# Altium footprint library PcbLibUltimate (1).pcblib: 202 footprints (part 6 of 13)
Each footprint in its own frame and in the unit in brackets; x right, y up, seen from the top. Pads: shape width x height; smd on the part's side, far side on the other; paste and mask are expansions set on the pad; w line width, h text height; cw(c..) or ccw(c..) is an arc to the next point about the centre after c.
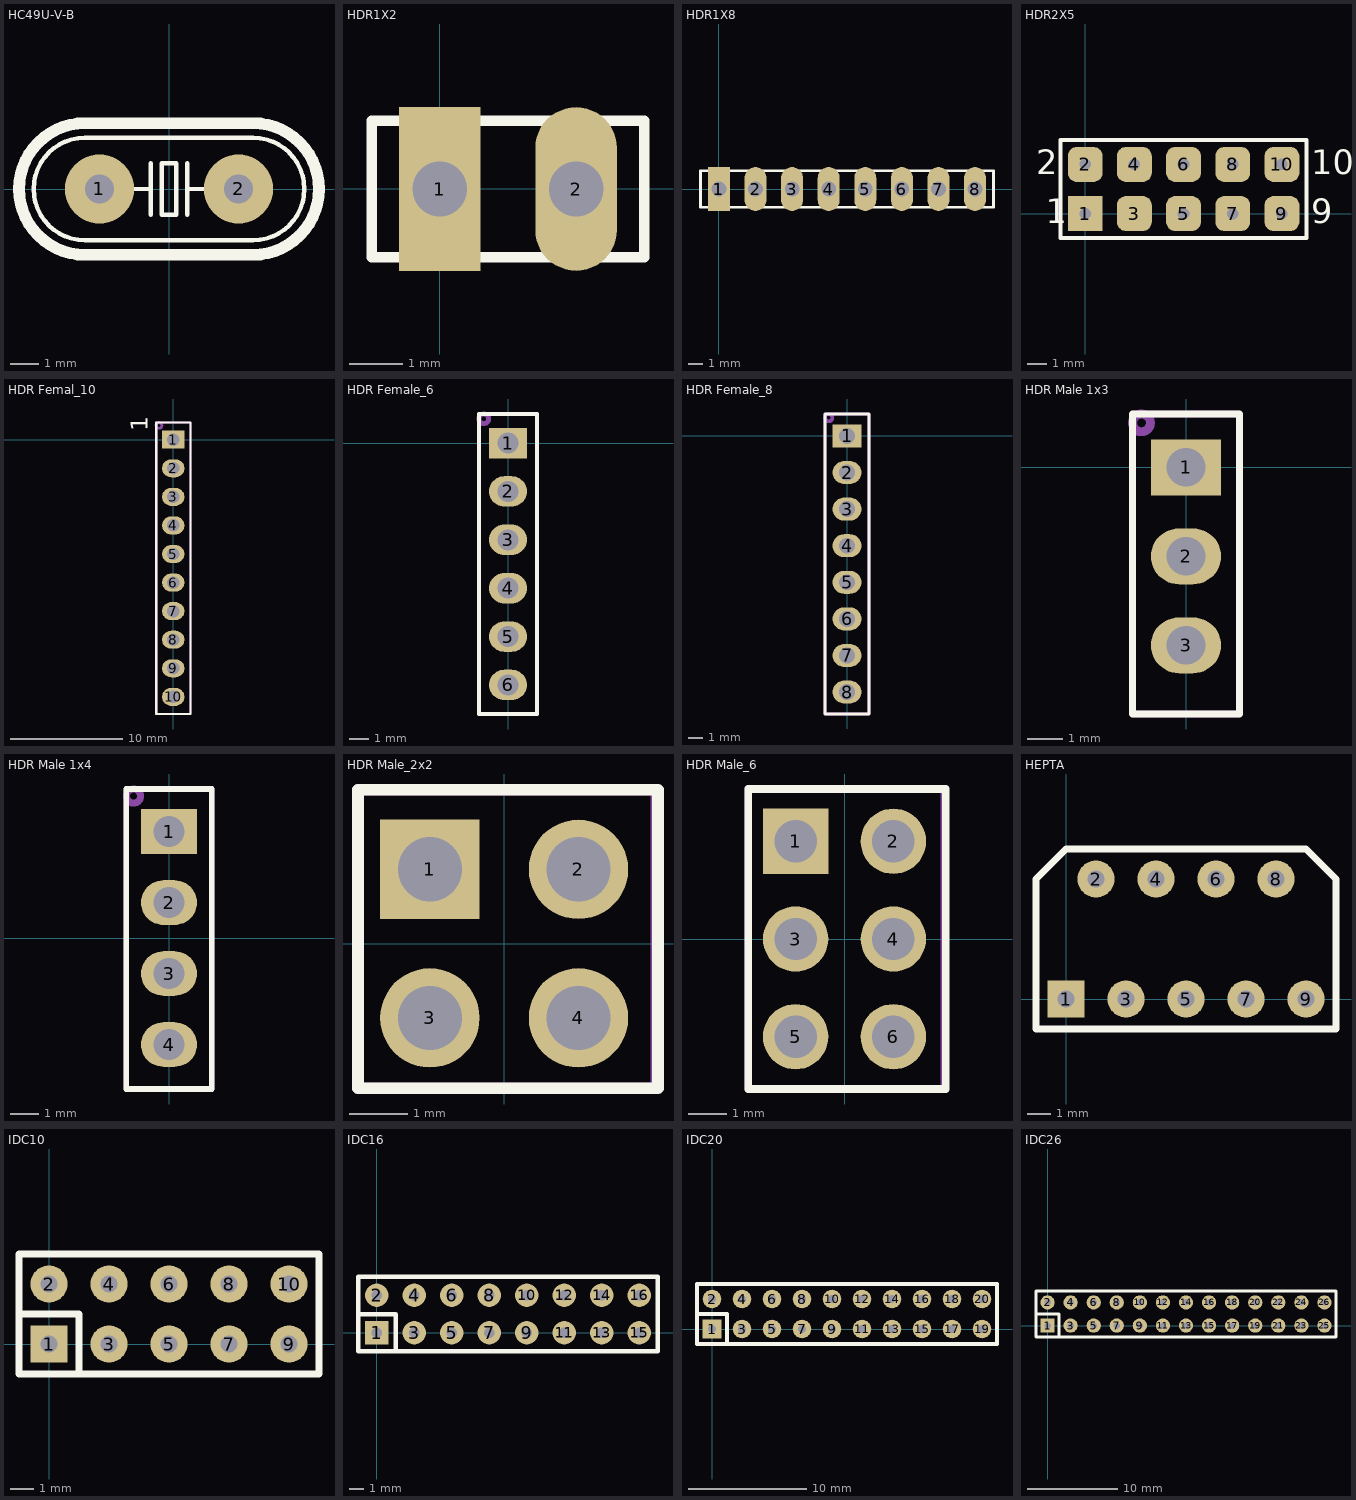
[diagram p5: the footprints below, top view; thin cyan lines are the x and y axes]

## HC49U-V-B [mm]
pads (2):
  round 2.4 hole 1: 1(-2.413,0) 2(2.413,0)
Top Overlay:
  lines w0.152: -1.27,0 -0.635,0 ; -0.635,-0.889 -0.635,0 ; -0.635,0.889 -0.635,0 ; 0.635,-0.889 0.635,0 ; 0.635,0.889 0.635,0 ; 1.27,0 0.635,0 ; -2.921,-1.778 cw(c-2.921,0) -2.921,1.778 2.921,1.778 cw(c2.921,0) 2.921,-1.778 -2.921,-1.778 ; -0.254,-0.889 -0.254,0.889 0.254,0.889 0.254,-0.889 -0.254,-0.889
  lines w0.406: -2.921,-2.286 cw(c-2.921,0) -2.921,2.286 2.921,2.286 cw(c2.921,0) 2.921,-2.286 -2.921,-2.286

## HDR1X2 [mil] "Connector; Header; 2 Position"
pads (2):
  rect 60x120 hole 40: 1(0,0)
  oval 60x120 hole 40: 2(100,0)
Top Overlay:
  lines w7.87: -50,-50 -50,50 150,50 150,-50 -50,-50
3D body "c-87224-2-l-3d.stp": height 408.55, standoff -124.45, extent -40.81,-45.99 143.19,46.01

## HDR1X8 [mil] "Connector; Header; 8 Position"
pads (8):
  rect 60x120 hole 40: 1(0,0)
  oval 60x120 hole 40: 2(100,0) 3(200,0) 4(300,0) 5(400,0) 6(500,0) 7(600,0) 8(700,0)
Top Overlay:
  lines w7.87: -50,-50 750,-50 750,50 -50,50 -50,-50

## HDR2X5 [mm] "Connector; Header; 5x2 Position"
pads (10):
  rect 1.8x1.8 hole 0.6: 1(0,0)
  rrect50% 1.8x1.8 hole 0.6: 2(0,2.54) 4(2.54,2.54) 5(5.08,0) 6(5.08,2.54) 7(7.62,0) 8(7.62,2.54) 9(10.16,0) 10(10.16,2.54)
  rrect50% 1.8x1.8 all layers, no hole: 3(2.54,0)
Top Overlay:
  lines w0.2: -1.27,-1.27 -1.27,3.81 11.43,3.81 11.43,-1.27 -1.27,-1.27
  text "2" at -2.54,2.032 h1.27
  text "1" at -2.032,-0.508 h1.27
  text "9" at 11.684,-0.508 h1.27
  text "10" at 11.684,2.032 h1.27
3D body "c-0087215-02-j-3d.stp": height 10.38, standoff -3.16, extent -1.047,-1.138 11.247,3.739

## HDR Femal_10 [mm]
pads (10):
  rect 2x1.6 / inner rect 2x1 / far side rect 2x1.6 hole 1.1: 1(0,0)
  oval 2x1.6 / inner oval 2x1 / far side oval 2x1.6 hole 1.1: 2(0,-2.54) 3(0,-5.08) 4(0,-7.62) 5(0,-10.16) 6(0,-12.7) 7(0,-15.24) 8(0,-17.78) 9(0,-20.32) 10(0,-22.86)
Top Overlay:
  lines w0.2: -1.524,-24.384 1.524,-24.384 1.524,1.524 -1.524,1.524 -1.524,-24.13 -1.524,-24.384
  text "1" at -2.286,0.762 h1.52
Mechanical 29:
  circle w0.254: c-1.27,1.27 r0.254
  lines w0.2: -1.524,-24.384 1.524,-24.384 1.524,1.524 -1.524,1.524 -1.524,-24.384
  text "'.Designator'" at 0.508,-10.668 h1.52
3D body "m20-7821046.stp": height 9, standoff -2.5, extent -1.25,-24.33 1.25,1.47

## HDR Female_6 [mm]
pads (6):
  rect 2x1.6 hole 1.1: 1(0,0)
  oval 2x1.6 hole 1.1: 2(0,-2.54) 3(0,-5.08) 4(0,-7.62) 5(0,-10.16) 6(0,-12.7)
Top Overlay:
  lines w0.2: -1.524,-14.224 1.524,-14.224 1.524,1.524 -1.524,1.524 -1.524,-14.224
Mechanical 29:
  circle w0.254: c-1.27,1.27 r0.254
  lines w0.2: -1.524,-14.224 -1.524,1.524 1.524,1.524 1.524,-14.224 -1.524,-14.224
  text "'.Designator'" at 0.762,-8.382 h1.52
3D body "m20-7820646_asm.stp": height 9, standoff -2.5, extent -1.23,-14.224 1.27,1.416

## HDR Female_8 [mm]
pads (8):
  rect 2x1.6 hole 1.1: 1(0,0)
  oval 2x1.6 hole 1.1: 2(0,-2.54) 3(0,-5.08) 4(0,-7.62) 5(0,-10.16) 6(0,-12.7) 7(0,-15.24) 8(0,-17.78)
Top Overlay:
  lines w0.2: -1.524,-19.304 1.524,-19.304 1.524,1.524 -1.524,1.524 -1.524,-19.304
Mechanical 29:
  circle w0.254: c-1.27,1.27 r0.254
  lines w0.2: -1.524,-19.304 -1.524,1.524 1.524,1.524 1.524,-19.304 -1.524,-19.304
  text "'.Designator'" at 0.254,-8.382 h1.52
3D body "m20-7820842_asm.stp": height 9, standoff -2.5, extent -1.27,-19.25 1.23,1.47

## HDR Male 1x3 [mm]
pads (3):
  rect 2x1.6 hole 1.1: 1(0,0)
  oval 2x1.6 hole 1.1: 2(0,-2.54) 3(0,-5.08)
Top Overlay:
  lines w0.2: -1.524,-7.04 1.524,-7.04 1.524,1.524 -1.524,1.524 -1.524,-7.04
Mechanical 29:
  circle w0.254: c-1.27,1.27 r0.254
  lines w0.2: -1.524,-7.04 -1.524,1.524 1.524,1.524 1.524,-7.04 -1.524,-7.04
  text "'.Designator'" at 0.762,-8.382 h1.52
3D body "HDR_1x3_White.stp": height 8.1, standoff -3.4, extent -1.21,-6.15 1.2,1.07

## HDR Male 1x4 [mm]
pads (4):
  rect 2x1.6 hole 1.1: 1(0,3.81)
  oval 2x1.6 hole 1.1: 2(0,1.27) 3(0,-1.27) 4(0,-3.81)
Top Overlay:
  lines w0.2: -1.524,-5.4 1.524,-5.4 1.524,5.334 -1.524,5.334 -1.524,-5.4
Mechanical 29:
  circle w0.254: c-1.27,5.08 r0.254
  lines w0.2: -1.524,-5.4 -1.524,5.334 1.524,5.334 1.524,-5.4 -1.524,-5.4
  text "'.Designator'" at 0.762,-4.572 h1.52
3D body "HDR_1x4_White.stp": height 8.1, standoff -3.4, extent -1.275,-4.873 1.135,4.887

## HDR Male_2x2 [mm]
pads (4):
  rect 1.7x1.7 hole 1.1: 1(-1.27,1.27)
  round 1.7 hole 1.1: 2(1.27,1.27) 3(-1.27,-1.27) 4(1.27,-1.27)
Top Overlay:
  lines w0.2: -0.105,2.63 2.63,2.63 2.63,0.68 2.63,-2.44 ; 0.105,2.63 -2.5,2.63 -2.5,-2.47 2.63,-2.47
Mechanical 29:
  lines w0.2: -2.5,-2.47 -2.5,2.63 2.6,2.63 2.6,-2.47 -2.5,-2.47
  text "'.Designator'" at 0.7,-2.47 h1.52
3D body "961204-6404-XX.stp": height 7.5, standoff -3.8, extent -2.54,-2.5 2.54,2.5

## HDR Male_6 [mm]
pads (6):
  rect 1.7x1.7 hole 1.1: 1(-1.27,2.54)
  round 1.7 hole 1.1: 2(1.27,2.54) 3(-1.27,0) 4(1.27,0) 5(-1.27,-2.54) 6(1.27,-2.54)
Top Overlay:
  lines w0.2: -0.105,3.9 2.63,3.9 2.63,1.95 2.63,-1.95 2.63,-3.9 -2.5,-3.9 -2.5,3.9 0.105,3.9
Mechanical 29:
  lines w0.2: -2.5,-3.9 2.6,-3.9 2.6,3.9 -2.5,3.9 -2.5,-3.9
  text "'.Designator'" at 0.5,-3.9 h1.52
3D body "961206-6404-XX.x_t": height 7.5, standoff -3.8, extent -2.5,-3.81 2.5,3.81

## HEPTA [mil]
pads (9):
  rect 62x62 hole 28: 1(0,0)
  round 62 hole 28: 2(50,200) 3(100,0) 4(150,200) 5(200,0) 6(250,200) 7(300,0) 8(350,200) 9(400,0)
Top Overlay:
  lines w12: -50,-50 -50,200 0,250 400,250 450,200 450,-50 -50,-50

## IDC10 [mil]
pads (10):
  rect 62x62 hole 28: 1(0,0)
  round 62 hole 28: 2(0,100) 3(100,0) 4(100,100) 5(200,0) 6(200,100) 7(300,0) 8(300,100) 9(400,0) 10(400,100)
Top Overlay:
  lines w12: -50,50 50,50 50,-50 ; -50,-50 450,-50 450,150 -50,150 -50,-50

## IDC16 [mil]
pads (16):
  rect 62x62 hole 28: 1(0,0)
  round 62 hole 28: 2(0,100) 3(100,0) 4(100,100) 5(200,0) 6(200,100) 7(300,0) 8(300,100) 9(400,0) 10(400,100) 11(500,0) 12(500,100) 13(600,0) 14(600,100) 15(700,0) 16(700,100)
Top Overlay:
  lines w12: -50,50 50,50 50,-50 ; -50,-50 -50,150 750,150 750,-50 -50,-50

## IDC20 [mil]
pads (20):
  rect 62x62 hole 28: 1(0,0)
  round 62 hole 28: 2(0,100) 3(100,0) 4(100,100) 5(200,0) 6(200,100) 7(300,0) 8(300,100) 9(400,0) 10(400,100) 11(500,0) 12(500,100) 13(600,0) 14(600,100) 15(700,0) 16(700,100) 17(800,0) 18(800,100) 19(900,0) 20(900,100)
Top Overlay:
  lines w12: -50,50 50,50 50,-50 ; -50,-50 -50,150 950,150 950,-50 -50,-50

## IDC26 [mil]
pads (26):
  rect 62x62 hole 28: 1(0,0)
  round 62 hole 28: 2(0,100) 3(100,0) 4(100,100) 5(200,0) 6(200,100) 7(300,0) 8(300,100) 9(400,0) 10(400,100) 11(500,0) 12(500,100) 13(600,0) 14(600,100) 15(700,0) 16(700,100) 17(800,0) 18(800,100) 19(900,0) 20(900,100) 21(1000,0) 22(1000,100) 23(1100,0) 24(1100,100) 25(1200,0) 26(1200,100)
Top Overlay:
  lines w12: -50,50 50,50 50,-50 ; -50,-50 -50,150 1250,150 1250,-50 -50,-50